# Altium footprint library KNR_Kurs.PcbLib: 250 footprints (part 3 of 16)
Each footprint in its own frame and in the unit in brackets; x right, y up, seen from the top. Pads: shape width x height; smd on the part's side, far side on the other; paste and mask are expansions set on the pad; w line width, h text height; cw(c..) or ccw(c..) is an arc to the next point about the centre after c.
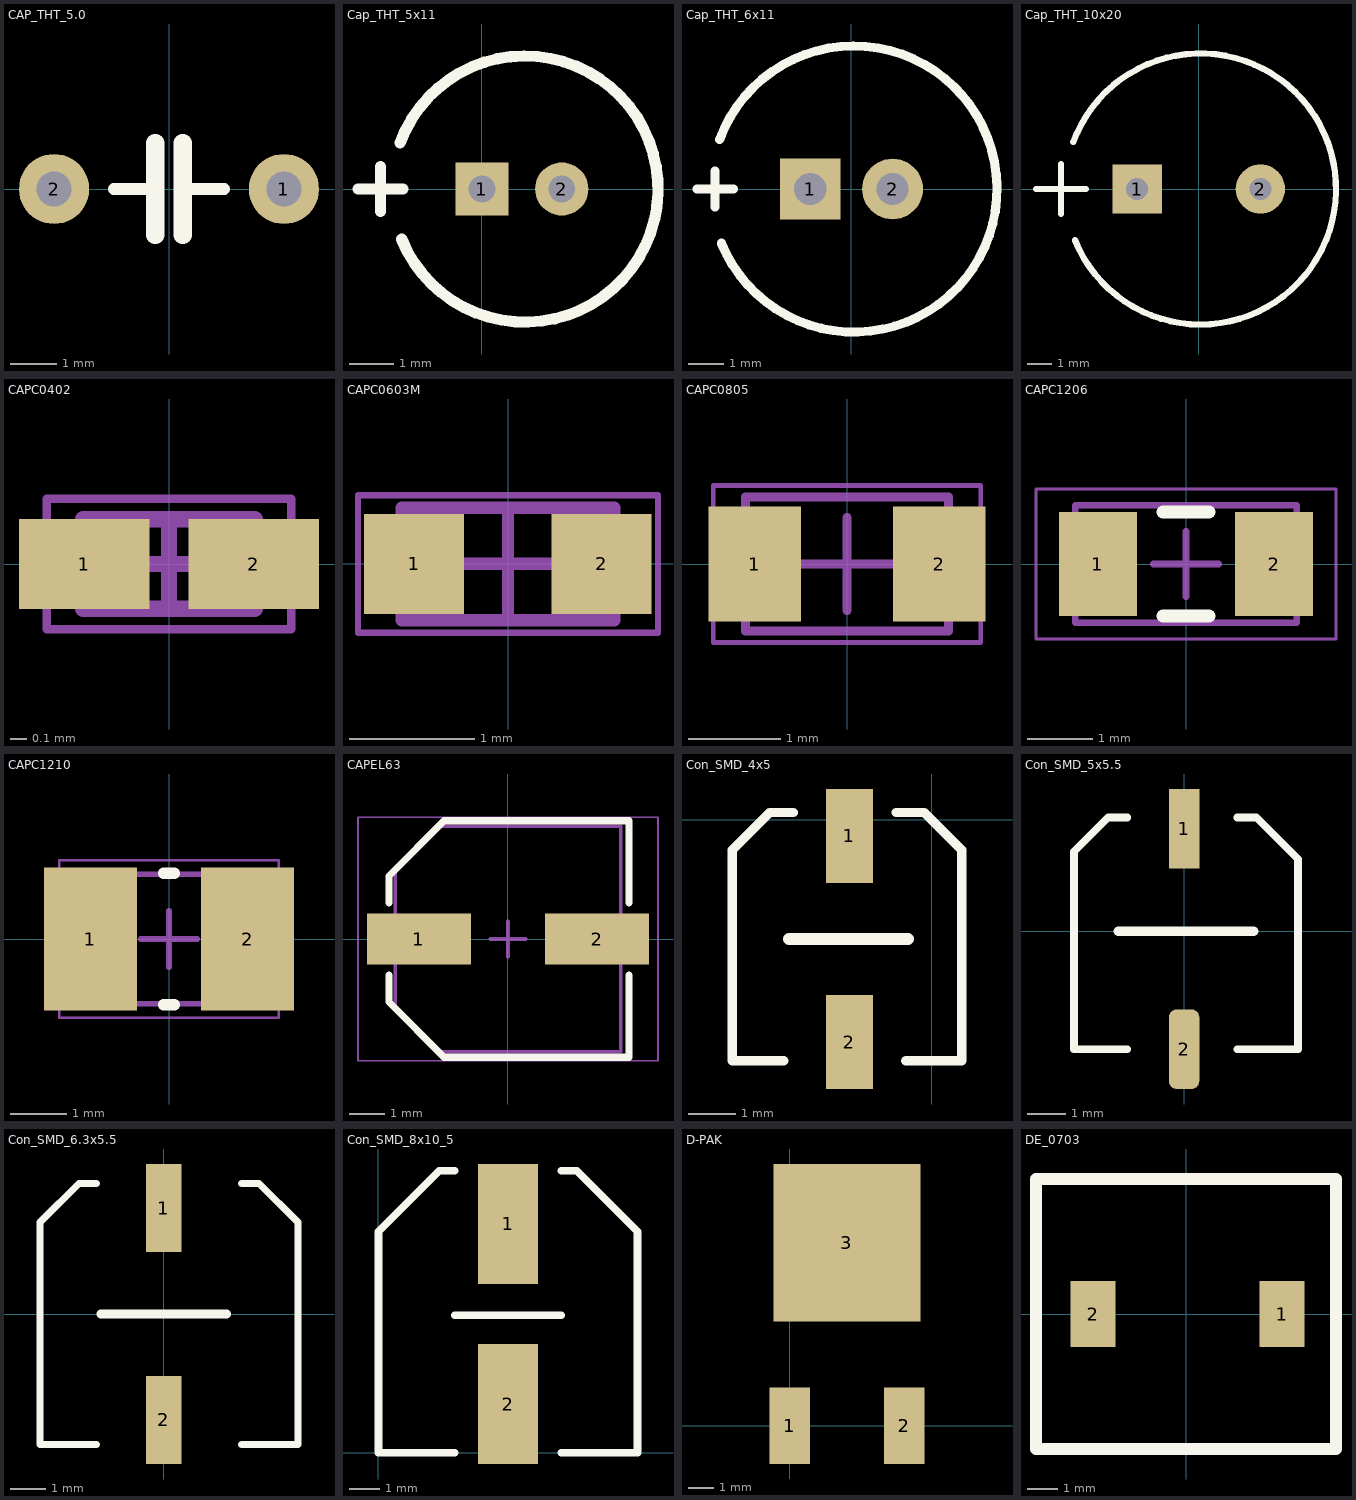
[diagram p2: the footprints below, top view; thin cyan lines are the x and y axes]

## CAP_THT_5.0 [mil] "Kondensator ceramiczny z rozstawem wyprowadzeñ 5mm"
pads (2):
  round 60 hole 30: 1(98.43,0) 2(-98.43,0)
Top Overlay:
  lines w10: -47.24,0 -19.68,0 ; 19.68,0 47.24,0
  lines w15.75: -11.81,-39.37 -11.81,39.37 ; 11.81,-39.37 11.81,39.37
3D body "cap_mon_tht_5.stp": height 275.59, standoff -39.37, extent -108.27,-39.37 108.27,39.37

## Cap_THT_5x11 [mm] "Cap_THT_5x11"
pads (2):
  rect 1.2x1.2 hole 0.6: 1(0,0)
  round 1.2 hole 0.6: 2(1.8,0)
Top Overlay:
  lines w0.254: -2.794,0 -1.778,0 ; -2.286,-0.508 -2.286,0.508 ; -1.846,1.041 cw(c0.968,0) -1.81,-1.133
3D body "Cap_THT_5x11.stp": height 11.5, standoff -2, extent -1.591,-2.495 3.4,2.495

## Cap_THT_6x11 [mm] "Cap_THT_6x11"
pads (2):
  rect 1.7x1.7 hole 0.9: 1(-1.15,0)
  round 1.7 hole 0.9: 2(1.15,0)
Top Overlay:
  lines w0.254: -4.318,0 -3.302,0 ; -3.81,-0.508 -3.81,0.508 ; -3.683,1.388 cw(c0.068,0) -3.636,-1.51
3D body "Cap_THT_6x11.stp": height 11.5, standoff -2, extent -3.125,-3.144 3.15,3.144

## Cap_THT_10x20 [mm] "Cap_THT_10x20"
pads (2):
  rect 2x2 hole 0.9: 1(-2.5,0)
  round 2 hole 0.9: 2(2.5,0)
Top Overlay:
  lines w0.254: -6.604,0 -4.572,0 ; -5.588,-1.016 -5.588,1.016 ; -5.09,1.909 cw(c0.068,0) -5.025,-2.076
3D body "User Library-CAP_Electrolytic_10X14_.step": height 14.1, standoff -4.72, extent -5,-4.999 5,4.999

## CAPC0402 [mm]
height 0.37
pads (2):
  rect 0.8x0.55 smd: 1(-0.52,0) 2(0.52,0)
Mechanical 13:
  lines w0.1: -0.525,-0.275 0.525,-0.275 0.525,0.275 -0.525,0.275 -0.525,-0.275
Mechanical 15:
  lines w0.05: -0.75,-0.4 0.75,-0.4 0.75,0.4 -0.75,0.4 -0.75,-0.4
  lines w0.1: -0.275,0 0.275,0 ; 0,-0.275 0,0.275
3D body "User Library-Chip Cap_MLCC_0402 (1005).step": height 0.48, standoff -0.02, extent -0.5,-0.25 0.5,0.25

## CAPC0603M [mm] "Chip Capacitor, 2-Leads, Body 1,60x0,80mm, IPC High Density"
height 0.55
pads (2):
  rect 0.8x0.8 smd: 1(-0.75,0) 2(0.75,0)
Mechanical 13:
  lines w0.1: -0.85,-0.45 0.85,-0.45 0.85,0.45 -0.85,0.45 -0.85,-0.45
Mechanical 15:
  lines w0.05: -1.2,-0.55 1.2,-0.55 1.2,0.55 -1.2,0.55 -1.2,-0.55
  lines w0.1: -0.45,0 0.45,0 ; 0,-0.45 0,0.45
3D body "User Library-Chip Cap_MLCC_0603 (1608).step": height 0.5, standoff 0, extent -0.8,-0.4 0.8,0.4

## CAPC0805 [mm] "Chip Capacitor, 2-Leads, Body 2,00x1,25mm, IPC High Density"
height 1.4
pads (2):
  rect 1x1.25 smd: 1(-1,0) 2(1,0)
Mechanical 13:
  lines w0.1: -1.1,-0.725 1.1,-0.725 1.1,0.725 -1.1,0.725 -1.1,-0.725
Mechanical 15:
  lines w0.05: -1.45,-0.85 1.45,-0.85 1.45,0.85 -1.45,0.85 -1.45,-0.85
  lines w0.1: -0.5,0 0.5,0 ; 0,-0.5 0,0.5
3D body "User Library-Chip Cap_MLCC_0805 (2012)_D.step": height 1.25, standoff 0, extent -1,-0.625 1,0.625

## CAPC1206 [mm] "Chip Capacitor, 2-Leads, Body 3,20x1,60mm, IPC Medium Density"
height 1.2
pads (2):
  rect 1.2x1.6 smd: 1(-1.35,0) 2(1.35,0)
Top Overlay:
  lines w0.2: -0.35,-0.8 0.35,-0.8 ; -0.35,0.8 0.35,0.8
Mechanical 13:
  lines w0.1: -1.7,-0.9 1.7,-0.9 1.7,0.9 -1.7,0.9 -1.7,-0.9
Mechanical 15:
  lines w0.05: -2.3,-1.15 2.3,-1.15 2.3,1.15 -2.3,1.15 -2.3,-1.15
  lines w0.1: -0.5,0 0.5,0 ; 0,-0.5 0,0.5
3D body "User Library-Chip Cap_MLCC_1206 (3216)_C.step": height 0.95, standoff 0, extent -1.6,-0.8 1.6,0.8

## CAPC1210 [mil] "Chip Capacitor, 2-Leads, Body 3,20x2,50mm, IPC High Density"
height 86.61
pads (2):
  rect 65x100 smd: 1(-55,0) 2(55,0)
Top Overlay:
  lines w7.87: -3.94,-46.06 3.94,-46.06 ; -3.94,46.06 3.94,46.06
Mechanical 13:
  lines w3.94: -66.93,-45.28 66.93,-45.28 66.93,45.28 -66.93,45.28 -66.93,-45.28
Mechanical 15:
  lines w1.97: -76.77,-55.12 76.77,-55.12 76.77,55.12 -76.77,55.12 -76.77,-55.12
  lines w3.94: -19.68,0 19.68,0 ; 0,-19.68 0,19.68
3D body "User Library-Chip Cap_MLCC_1210 (3225)_C.step": height 37.4, standoff 0, extent -62.99,-49.21 62.99,49.21

## CAPEL63 [mm] "Nichicon Aluminum Electrolytic Capacitor, Body 6.3×7.7"
height 8
pads (2):
  rect 2.95x1.45 smd: 1(-2.525,0) 2(2.525,0)
Top Overlay:
  lines w0.2: -3.375,-1.025 -3.375,-1.787 -1.812,-3.35 3.425,-3.35 3.425,-1.025 ; -3.375,1.025 -3.375,1.787 -1.812,3.35 3.425,3.35 3.425,1.025
Mechanical 13:
  lines w0.1: -3.2,-1.963 -1.962,-3.2 3.2,-3.2 3.2,3.2 -1.962,3.2 -3.2,1.963 -3.2,-1.963
Mechanical 15:
  lines w0.05: -4.25,-3.45 -4.25,3.45 4.25,3.45 4.25,-3.45 -4.25,-3.45
  lines w0.1: -0.5,0 0.5,0 ; 0,-0.5 0,0.5
3D body "User Library-ALU-D8.STEP": height 7.7, standoff 0, extent -3.5,-3.3 3.5,3.3

## Con_SMD_4x5 [mm] "SMD electrolytic capacitor"
pads (2):
  rect 1x2 smd: 1(-1.76,-0.34) 2(-1.76,-4.74)
Top Overlay:
  lines w0.2: -3.16,-5.14 -4.26,-5.14 -4.26,-0.64 -3.46,0.16 -2.96,0.16 ; -0.76,0.16 -0.16,0.16 0.64,-0.64 0.64,-5.14 -0.56,-5.14
  lines w0.254: -3.048,-2.54 -0.508,-2.54
3D body "Con_SMD_4x5.stp": height 5.48, standoff 0, extent -3.885,-4.64 0.415,-0.12

## Con_SMD_5x5.5 [mm] "SMD electrolytic capacitor"
pads (2):
  rect 0.8x2.1 smd: 1(0,2.7)
  rrect50% 0.8x2.1 smd: 2(0,-3.1)
Top Overlay:
  lines w0.2: -1.5,-3.1 -2.9,-3.1 -2.9,2.1 -2,3 -1.5,3 ; 1.4,-3.1 3,-3.1 3,1.9 1.9,3 1.4,3
  lines w0.254: -1.728,0 1.828,0
3D body "Con_SMD_5x5_5.stp": height 5.81, standoff 0, extent -2.6,-2.76 2.7,2.76

## Con_SMD_6.3x5.5 [mm] "SMD electrolytical capacitor"
pads (2):
  rect 1x2.5 smd: 1(0,3) 2(0,-3)
Top Overlay:
  lines w0.2: -1.9,-3.7 -3.5,-3.7 -3.5,2.6 -2.4,3.7 -1.9,3.7 ; 2.2,-3.7 3.8,-3.7 3.8,2.6 2.7,3.7 2.2,3.7
  lines w0.254: -1.778,0 1.778,0
3D body "Con_SMD_6_3x5_5.stp": height 5.91, standoff 0, extent -3.1,-3.41 3.5,3.41

## Con_SMD_8x10_5 [mm] "Base 8,2mm height 10mm, 220uF, 35V AD6"
pads (2):
  rect 2x4 smd: 1(4.318,7.62) 2(4.318,1.62)
Top Overlay:
  lines w0.254: 2.54,0 0,0 0,7.366 2.032,9.398 2.54,9.398 ; 2.54,4.572 6.096,4.572 ; 6.096,0 8.636,0 8.636,7.366 6.604,9.398 6.096,9.398
3D body "Con_SMD_8x10_5.stp": height 10.21, standoff 0, extent 0.182,0.472 8.382,8.672

## D-PAK [mm]
pads (3):
  rect 1.6x3 smd: 1(0,0) 2(4.5,0)
  rect 5.8x6.2 smd: 3(2.25,7.2)
3D body "TO252_D-Pak.stp": height 2.2, standoff 0, extent -1,-0.47 5.5,9.47

## DE_0703 [mm]
pads (2):
  rect 1.5x2.2 smd: 1(3.2,0) 2(-3.1,0)
Top Overlay:
  lines w0.4: -5,-4.5 5,-4.5 5,4.5 -5,4.5 -5,-4.5
3D body "DE0703.stp": height 3.3, standoff 0, extent -3.65,-3.65 3.65,3.65